# Altium footprint library DM2097_R1M1E1.PcbLib: 70 footprints (part 1 of 5)
Each footprint in its own frame and in the unit in brackets; x right, y up, seen from the top. Pads: shape width x height; smd on the part's side, far side on the other; paste and mask are expansions set on the pad; w line width, h text height; cw(c..) or ccw(c..) is an arc to the next point about the centre after c.
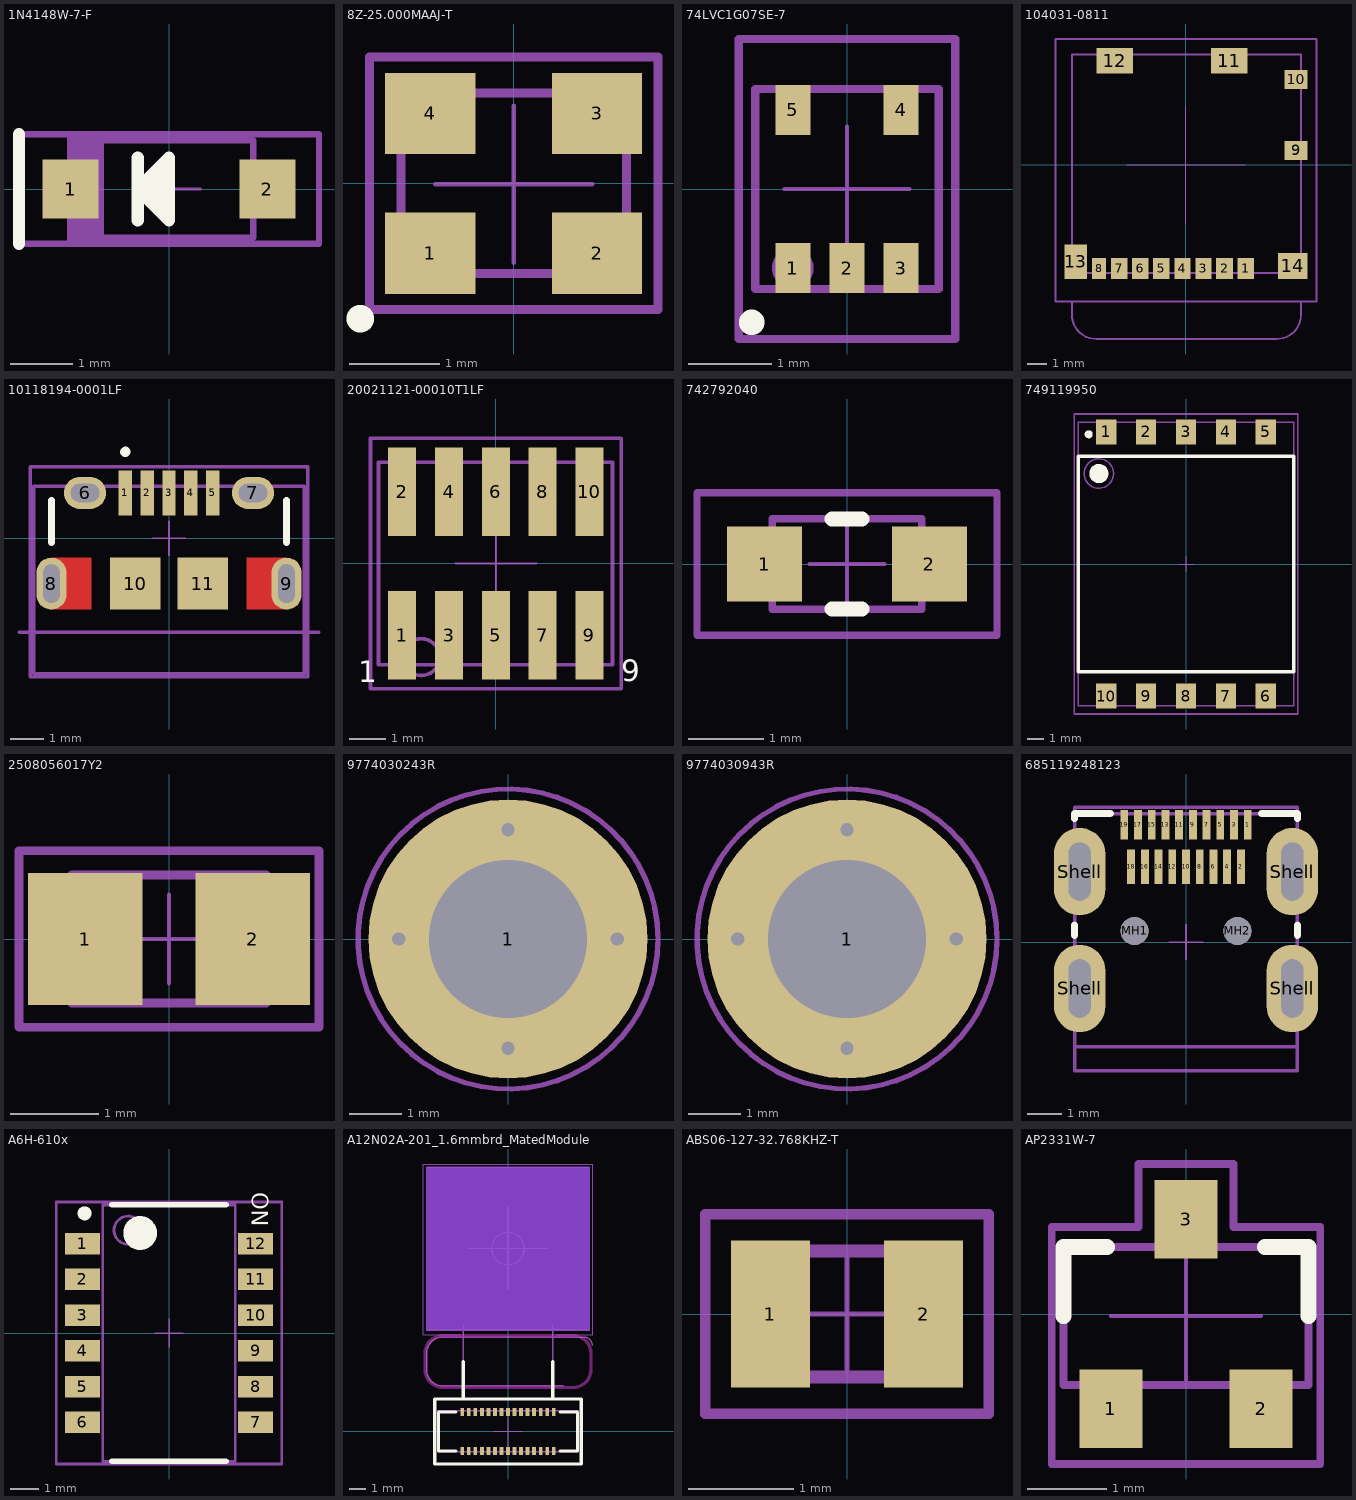
[diagram p0: the footprints below, top view; thin cyan lines are the x and y axes]

## 1N4148W-7-F [mm] "SOD123, 2-Leads, Body 2.7x1.55mm, Height 1.45mm"
height 1.45
pads (2):
  rect 0.9x0.95 smd: 1(-1.575,0) 2(1.575,0)
Top Overlay:
  region: 0,-0.5 0,0.5 -0.5,0
  lines w0.2: -2.4,-0.875 -2.4,0.875 ; -0.5,-0.5 -0.5,0 ; -0.5,0.5 -0.5,0 ; -0.5,0 0,-0.5 0,0.5 -0.5,0
Top Assembly:
  region: -1.044,-0.875 -1.044,0.875 -1.628,0.875 -1.628,-0.875
  lines w0.1: -2.4,-0.875 -2.4,0.875 2.4,0.875 2.4,-0.875 -2.4,-0.875
  text "'.Designator'" at 0,0 h1
Top Courtyard:
  lines w0.05: -0.5,0 0.5,0 ; 0,-0.5 0,0.5 ; -2.4,-0.875 -2.4,0.875 2.4,0.875 2.4,-0.875 -2.4,-0.875
Top Component Outline:
  lines w0.1: -1.35,-0.775 1.35,-0.775 1.35,0.775 -1.35,0.775 -1.35,-0.775
3D body: height 1.45, standoff 0, extent -1.35,-0.775 1.35,0.775

## 8Z-25.000MAAJ-T [mm] "2.5 x 2.0 x 0.5mm 8Z series XTAL"
height 0.55
pads (4):
  rect 1x0.9 smd: 1(-0.925,-0.775) 2(0.925,-0.775) 3(0.925,0.775) 4(-0.925,0.775)
Top Overlay:
  circle w0.254: c-1.7,-1.5 r0.025
Top Assembly:
  lines w0.1: -1.6,-1.4 -1.6,1.4 1.6,1.4 1.6,-1.4 -1.6,-1.4
  text "'.Designator'" at 0,-0.011 h1
Top Courtyard:
  lines w0.05: -0.87,-0.011 0,-0.011 ; 0,-0.881 0,-0.011 ; 0,0.859 0,-0.011 ; 0.87,-0.011 0,-0.011 ; -1.6,-1.4 -1.6,1.4 1.6,1.4 1.6,-1.4 -1.6,-1.4
Top Component Outline:
  lines w0.1: -1.25,-1 1.25,-1 1.25,1 -1.25,1 -1.25,-1
3D body: height 0.55, standoff 0, extent -1.25,-1 1.25,1

## 74LVC1G07SE-7 [mm] "SC70-5 1.1mm"
height 1.1
pads (5):
  rect 0.42x0.6 smd paste-0.025 mask+0.05: 1(-0.65,-0.95) 2(0,-0.95) 3(0.65,-0.95) 4(0.65,0.95) 5(-0.65,0.95)
Top Overlay:
  circle w0.254: c-1.143,-1.6 r0.025
Top Assembly:
  circle w0.1: c-0.65,-0.95 r0.2
  lines w0.1: -1.3,-1.8 -1.3,1.8 1.3,1.8 1.3,-1.8 -1.3,-1.8
  text "'.Designator'" at 0,0 h1
Top Courtyard:
  lines w0.05: -0.75,0 0,0 ; 0,-0.75 0,0 ; 0,0.75 0,0 ; 0.75,0 0,0 ; -1.3,-1.8 1.3,-1.8 1.3,1.8 -1.3,1.8 -1.3,-1.8
Top Component Outline:
  lines w0.1: -1.1,-1.2 1.1,-1.2 1.1,1.2 -1.1,1.2 -1.1,-1.2
3D body "User Library-SOT353-1.step": height 1.1, standoff 0, extent -1.1,-1.2 1.1,1.2

## 104031-0811 [mm] "10 (8 + 2) Position Card Connector Secure Digital - microSD™ Surface Mount, Right Angle Gold"
height 1.42
pads (14):
  rect 0.85x1.1 smd: 1(3.113,-5.412) 3(0.913,-5.412) 4(-0.188,-5.412) 5(-1.288,-5.412) 6(-2.387,-5.412) 7(-3.487,-5.412)
  rect 0.875x1.1 smd: 2(2.013,-5.412)
  rect 0.75x1.1 smd: 8(-4.537,-5.412)
  rect 1.2x1 smd: 9(5.748,0.738) 10(5.748,4.438)
  rect 1.9x1.35 smd: 11(2.248,5.413) 12(-3.722,5.413)
  rect 1.17x1.8 smd: 13(-5.747,-5.062)
  rect 1.55x1.35 smd: 14(5.573,-5.287)
Top Assembly:
  lines w0.1: -5.95,-7.15 -5.95,-7.83 ccw(c-4.68,-7.83) -4.68,-9.1 -3.7,-9.1 4.73,-9.1 ccw(c4.73,-7.83) 6,-7.83 6,-7.15 ; -5.95,-7.15 -6.8,-7.15 -6.8,-6.75 -6.8,6.55 4.1,6.55 6.8,6.55 6.8,-5.412 6.8,-7.15 6,-7.15 ; -5.95,-7.15 6,-7.15
  text "'.Designator'" at 0,0 h1
Top Courtyard:
  lines w0.05: -3.1,0 0,0 ; 0,-3.1 0,0 ; 0,3.1 0,0 ; 3.1,0 0,0 ; -6.8,-7.15 -6.8,6.55 6.8,6.55 6.8,-7.15 -6.8,-7.15
Top Component Outline:
  lines w0.1: -5.95,-5.65 6,-5.65 6,5.75 -5.95,5.75 -5.95,-5.65
3D body "1040310811.stp": height 1.44, standoff -0.01, extent -5.95,-5.65 6,5.75

## 10118194-0001LF [mm] "FCI-10118194-0001LF-5_V SMD, 5-Leads, Body 7x5mm, Pitch 0.65 mm"
height 2.673
pads (11):
  rect 0.4x1.35 smd: 1(-1.3,1.35) 2(-0.65,1.35) 3(0,1.35) 4(0.65,1.35) 5(1.3,1.35)
  oval 1.25x0.95 hole 0.55 slot 0.85 at 0 deg: 6(-2.5,1.35) 7(2.5,1.35)
  oval 0.9x1.55 hole 0.5 slot 1.15 at 90 deg: 8(-3.5,-1.35) 9(3.5,-1.35)
  rect 1.5x1.55 smd: 10(-1,-1.35) 11(1,-1.35)
Top Layer:
  region: 3.5,-2.125 3.5,-0.575 2.3,-0.575 2.3,-2.125
  region: -2.3,-2.125 -2.3,-0.575 -3.5,-0.575 -3.5,-2.125
Top Overlay:
  circle w0.254: c-1.3,2.575 r0.025
  lines w0.2: -3.5,-0.125 -3.5,1.13 ; 3.5,-0.125 3.5,1.13
Top Assembly:
  lines w0.1: -4.465,-2.8 0,-2.8 4.465,-2.8 ; -4.125,-4.13 -4.125,2.125 4.125,2.125 4.125,-4.13 -4.125,-4.13
  text "PCB EDGE" at -7.2,-2.9 h0.3
  text "'.Designator'" at 1.93,0.076 h1
Top Courtyard:
  lines w0.05: -0.5,0 0.5,0 ; 0,-0.5 0,0.5 ; -4.125,-4.13 4.125,-4.13 4.125,2.125 -4.125,2.125 -4.125,-4.13
Top Component Outline:
  lines w0.1: -4.025,-4.03 4.025,-4.03 4.025,1.55 -4.025,1.55 -4.025,-4.03
3D body "10118194c.stp": height 2.72, standoff -0.55, extent -4.025,-4.03 4.025,1.55

## 20021121-00010T1LF [mm] "Connector Header Surface Mount 10 position 0.050\" (1.27mm)   Contact length: 0.120\" (3.05mm)"
height 4
pads (10):
  rect 0.76x2.4 smd: 1(-2.54,-1.95) 2(-2.54,1.95) 3(-1.27,-1.95) 4(-1.27,1.95) 5(0,-1.95) 6(0,1.95) 7(1.27,-1.95) 8(1.27,1.95) 9(2.54,-1.95) 10(2.54,1.95)
Top Overlay:
  text "9" at 3.4,-3.4 h1
  text "1" at -3.737,-3.429 h1
Top Assembly:
  lines w0.1: -3.4,-3.4 -3.4,3.4 3.4,3.4 3.4,-3.4 -3.4,-3.4 ; -1.524,-2.54 ccw(c-2.024,-2.54) -1.524,-2.54
  text "'.Designator'" at 0,0 h1
Top Courtyard:
  lines w0.05: -1.1,0 0,0 ; 0,-1.1 0,0 ; 0,1.1 0,0 ; 1.1,0 0,0 ; -3.4,-3.4 3.4,-3.4 3.4,3.4 -3.4,3.4 -3.4,-3.4
Top Component Outline:
  lines w0.1: -3.184,-2.75 3.166,-2.75 3.166,2.75 -3.184,2.75 -3.184,-2.75
3D body "20021121-00010T1LF.stp": height 4.55, standoff 0, extent -3.184,-2.75 3.166,2.75

## 742792040 [mm] "Chip Inductor, 2-Leads, Body 2.0x1.2mm"
height 1.1
pads (2):
  rect 1x1 smd: 1(-1.1,0) 2(1.1,0)
Top Overlay:
  lines w0.1: 0,0.6 -0.2,0.6 ; -0.2,0.6 -0.2,0.6
  lines w0.2: -0.2,-0.6 0.2,-0.6 ; -0.2,0.6 0.2,0.6
Top Assembly:
  lines w0.1: -2,-0.95 -2,0.95 2,0.95 2,-0.95 -2,-0.95
  text "'.Designator'" at 0,0 h1
Top Courtyard:
  lines w0.05: -0.5,0 0.5,0 ; 0,-0.5 0,0.5 ; -2,-0.95 -2,0.95 2,0.95 2,-0.95 -2,-0.95
Top Component Outline:
  lines w0.1: -1,-0.6 -1,0.6 1,0.6 1,-0.6 -1,-0.6
3D body "74279201.stp": height 0.89, standoff -0.01, extent -1,-0.6 1,0.6

## 749119950 [mm] "SMD, 10-Leads, Body 13.5x14.0mm (max), Pitch 2.48mm, IPC Medium Density"
height 12.5
pads (10):
  rect 1.27x1.55 smd: 1(-5,8.275) 2(-2.5,8.275) 3(0,8.275) 4(2.5,8.275) 5(5,8.275) 6(5,-8.275) 7(2.5,-8.275) 8(0,-8.275) 9(-2.5,-8.275) 10(-5,-8.275)
Top Overlay:
  circle w0.25: c-6.096,8.13 r0.125
  circle w0.6: c-5.461,5.669 r0.3
  lines w0.2: -6.75,-6.75 6.75,-6.75 6.75,6.75 -6.75,6.75 -6.75,-6.75
Top Assembly:
  circle w0.1: c-5.461,5.669 r0.921
  lines w0.1: -7,-9.4 7,-9.4 7,4.75 7,9.4 -7,9.4 -7,9.1 -7,-9.4
  text "'.Designator'" at 0,0 h1
Top Courtyard:
  lines w0.05: -0.5,0 0.5,0 ; 0,-0.5 0,0.5 ; -7,-9.4 7,-9.4 7,9.4 -7,9.4 -7,-9.4
Top Component Outline:
  lines w0.1: -6.75,-8.875 6.75,-8.875 6.75,8.875 -6.75,8.875 -6.75,-8.875
3D body "WE-PoE_EP13_PoE.stp": height 12.6, standoff 0.1, extent -6.75,-8.875 6.75,8.875

## 2508056017Y2 [mm] "2508056017Y2 Chip Inductor, 2-Leads, Body 2.00x1.25mm"
height 1.1
pads (2):
  rect 1.3x1.5 smd: 1(-0.95,0) 2(0.95,0)
Top Assembly:
  lines w0.1: -1.7,-1 1.7,-1 1.7,1 -1.7,1 -1.7,-1
  text "'.Designator'" at 0.004,0 h1
Top Courtyard:
  lines w0.05: -0.5,0 0.5,0 ; 0,-0.5 0,0.5 ; -1.7,-1 -1.7,1 1.7,1 1.7,-1 -1.7,-1
Top Component Outline:
  lines w0.1: -1.1,-0.725 1.1,-0.725 1.1,0.725 -1.1,0.725 -1.1,-0.725
3D body: height 1.45, standoff 0, extent -0.596,-0.725 0.604,0.725
3D body: height 1.45, standoff 0, extent -1.096,-0.725 -0.596,0.725
3D body: height 1.45, standoff 0, extent 0.604,-0.725 1.104,0.725

## 9774030243R [mm] "STANDOFF_M2X0.4_3MM with no pad on bottom of PCB"
height 3
pads (1):
  round 5.3 / inner round 2.7 / far side round 5.3 hole 3 mask+0.05: 1(0,0)
via 0,2.075 diameter 0.508 hole 0.254
via 0,-2.075 diameter 0.508 hole 0.254
via -2.075,0 diameter 0.508 hole 0.254
via 2.075,0 diameter 0.508 hole 0.254
Top Paste:
  region: 0.317,2.581 0.278,1.576 0.397,1.55 0.628,1.471 0.845,1.359 1.042,1.214 1.214,1.042 1.359,0.845 1.471,0.628 1.55,0.397 1.576,0.278 2.581,0.317 2.554,0.531 2.432,0.946 2.242,1.334 1.991,1.686 1.686,1.991 1.334,2.242 0.946,2.432 0.531,2.554
  region: 2.581,-0.317 1.576,-0.278 1.55,-0.397 1.471,-0.628 1.359,-0.845 1.214,-1.042 1.042,-1.214 0.845,-1.359 0.628,-1.471 0.397,-1.55 0.278,-1.576 0.317,-2.581 0.531,-2.554 0.946,-2.432 1.334,-2.242 1.686,-1.991 1.991,-1.686 2.242,-1.334 2.432,-0.946 2.554,-0.531
  region: -0.317,-2.581 -0.278,-1.576 -0.397,-1.55 -0.628,-1.471 -0.845,-1.359 -1.042,-1.214 -1.214,-1.042 -1.359,-0.845 -1.471,-0.628 -1.55,-0.397 -1.576,-0.278 -2.581,-0.317 -2.554,-0.531 -2.432,-0.946 -2.242,-1.334 -1.991,-1.686 -1.686,-1.991 -1.334,-2.242 -0.946,-2.432 -0.531,-2.554
  region: -2.581,0.317 -1.576,0.278 -1.55,0.397 -1.471,0.628 -1.359,0.845 -1.214,1.042 -1.042,1.214 -0.845,1.359 -0.628,1.471 -0.397,1.55 -0.278,1.576 -0.317,2.581 -0.531,2.554 -0.946,2.432 -1.334,2.242 -1.686,1.991 -1.991,1.686 -2.242,1.334 -2.432,0.946 -2.554,0.531
Top Assembly:
  circle w0.1: c0,0 r2.85
  text "'.Designator'" at 0,0 h1
Top Courtyard:
  circle w0.05: c0,0 r2.85
  lines w0.05: -0.5,0 0.5,0 ; 0,-0.5 0,0.5
Bottom Courtyard:
  circle w0.05: c0,0 r2.85
Top Component Outline:
  circle w0.1: c0,0 r2.175
3D body "9774030243R (rev1).stp": height 3.05, standoff -1.35, extent -2.175,-2.172 2.175,2.172

## 9774030943R [mm] "STANDOFF_2.25mmX0.4_3MM with pad on bottom of PCB"
height 3
pads (1):
  round 5.3 / inner round 2.7 / far side round 5.3 hole 3 mask+0.05: 1(0,0)
via 2.075,0 diameter 0.508 hole 0.254
via -2.075,0 diameter 0.508 hole 0.254
via 0,-2.075 diameter 0.508 hole 0.254
via 0,2.075 diameter 0.508 hole 0.254
Top Paste:
  region: -2.581,0.317 -1.576,0.278 -1.55,0.397 -1.471,0.628 -1.359,0.845 -1.214,1.042 -1.042,1.214 -0.845,1.359 -0.628,1.471 -0.397,1.55 -0.278,1.576 -0.317,2.581 -0.531,2.554 -0.946,2.432 -1.334,2.242 -1.686,1.991 -1.991,1.686 -2.242,1.334 -2.432,0.946 -2.554,0.531
  region: -0.317,-2.581 -0.278,-1.576 -0.397,-1.55 -0.628,-1.471 -0.845,-1.359 -1.042,-1.214 -1.214,-1.042 -1.359,-0.845 -1.471,-0.628 -1.55,-0.397 -1.576,-0.278 -2.581,-0.317 -2.554,-0.531 -2.432,-0.946 -2.242,-1.334 -1.991,-1.686 -1.686,-1.991 -1.334,-2.242 -0.946,-2.432 -0.531,-2.554
  region: 2.581,-0.317 1.576,-0.278 1.55,-0.397 1.471,-0.628 1.359,-0.845 1.214,-1.042 1.042,-1.214 0.845,-1.359 0.628,-1.471 0.397,-1.55 0.278,-1.576 0.317,-2.581 0.531,-2.554 0.946,-2.432 1.334,-2.242 1.686,-1.991 1.991,-1.686 2.242,-1.334 2.432,-0.946 2.554,-0.531
  region: 0.317,2.581 0.278,1.576 0.397,1.55 0.628,1.471 0.845,1.359 1.042,1.214 1.214,1.042 1.359,0.845 1.471,0.628 1.55,0.397 1.576,0.278 2.581,0.317 2.554,0.531 2.432,0.946 2.242,1.334 1.991,1.686 1.686,1.991 1.334,2.242 0.946,2.432 0.531,2.554
Top Assembly:
  circle w0.1: c0,0 r2.85
  text "'.Designator'" at 0,0 h1
Top Courtyard:
  circle w0.05: c0,0 r2.85
  lines w0.05: -0.5,0 0.5,0 ; 0,-0.5 0,0.5
Bottom Courtyard:
  circle w0.05: c0,0 r2.85
Top Component Outline:
  circle w0.1: c0,0 r2.175
3D body "9774030943 (rev1).stp": height 3.05, standoff -1.35, extent -2.175,-2.172 2.175,2.172

## 685119248123 [mm] "Micro HDMI Horizontal SMT"
height 3
pads (25):
  rect 0.23x0.85 smd: 1(1.8,3.425) 3(1.4,3.425) 5(1,3.425) 7(0.6,3.425) 9(0.2,3.425) 11(-0.2,3.425) 13(-0.6,3.425) 15(-1,3.425) 17(-1.4,3.425) 19(-1.8,3.425)
  rect 0.23x1 smd: 2(1.6,2.2) 4(1.2,2.2) 6(0.8,2.2) 8(0.4,2.2) 10(0,2.2) 12(-0.4,2.2) 14(-0.8,2.2) 16(-1.2,2.2) 18(-1.6,2.2)
  round 0.81 hole 0.81 unplated: MH1(-1.5,0.33) MH2(1.5,0.33)
  oval 1.5x2.55 hole 0.65 slot 1.7 at 90 deg: Shell(-3.1,-1.35) Shell(-3.1,2.06) Shell(3.1,-1.35) Shell(3.1,2.06)
Top Overlay:
  lines w0.2: -3.25,0.2 -3.25,0.5 ; -3.25,3.6 -3.25,3.75 -2.2,3.75 ; 2.2,3.75 3.25,3.75 3.25,3.6 ; 3.25,0.2 3.25,0.5
Top Assembly:
  lines w0.1: -3.25,-3.05 3.25,-3.05 3.25,3.937 -3.25,3.937 -3.25,-3.05
  text "'.Designator'" at 0,0 h1
  text "PCB Edge" at -1.219,-3.683 h0.41
Top 3D Body:
  lines w0.1: -3.25,-3.75 3.25,-3.75 3.25,3.75 -3.25,3.75 -3.25,-3.75
Top Courtyard:
  lines w0.05: -0.5,0 0.5,0 ; 0,-0.5 0,0.5
3D body "685119248123.stp": height 2.99, standoff -1.11, extent -3.25,-3.75 3.25,3.755

## A6H-610x [mm] "DIP Sw, Std/SealTape Body 8.85x4.50mm, Pitch 1.27mm, IPC High Density"
height 1.55
pads (12):
  rect 1.25x0.76 smd: 1(-3.075,3.175) 2(-3.075,1.905) 3(-3.075,0.635) 4(-3.075,-0.635) 5(-3.075,-1.905) 6(-3.075,-3.175) 7(3.075,-3.175) 8(3.075,-1.905) 9(3.075,-0.635) 10(3.075,0.635) 11(3.075,1.905) 12(3.075,3.175)
Top Overlay:
  circle w0.25: c-3,4.25 r0.125
  circle w0.6: c-1.025,3.55 r0.3
  lines w0.2: -2.025,-4.55 2.025,-4.55 ; -2.025,4.55 2.025,4.55
  text "ON" at 2.75,5 h1
Top Assembly:
  circle w0.1: c-1.45,3.65 r0.5
  lines w0.1: -4,-4.65 -4,4.65 4,4.65 4,-4.65 -4,-4.65
  text "'.Designator'" at 0,0 h1
Top Courtyard:
  lines w0.05: -0.5,0 0.5,0 ; 0,-0.5 0,0.5 ; -4,-4.65 -4,4.65 4,4.65 4,-4.65 -4,-4.65
Top Component Outline:
  lines w0.1: -2.35,-4.55 -2.35,4.55 2.35,4.55 2.35,-4.55 -2.35,-4.55
3D body "KAN1106Rx.stp": height 1.57, standoff 0, extent -3.35,-4.425 3.35,4.425

## A12N02A-201_1.6mmbrd_MatedModule [mm] "connector: 24-5804-030-000-829+ (1.4mm height w/ module mated)"
height 1.4
pads (30):
  rect 0.22x0.5 smd mask+0.05: 1(-2.8,-1.2) 2(-2.4,-1.2) 3(-2,-1.2) 4(-1.6,-1.2) 5(-1.2,-1.2) 6(-0.8,-1.2) 7(-0.4,-1.2) 8(0,-1.2) 9(0.4,-1.2) 10(0.8,-1.2) 11(1.2,-1.2) 12(1.6,-1.2) 13(2,-1.2) 14(2.4,-1.2) 15(2.8,-1.2) 16(2.8,1.2) 17(2.4,1.2) 18(2,1.2) 19(1.6,1.2) 20(1.2,1.2) 21(0.8,1.2) 22(0.4,1.2) 23(0,1.2) 24(-0.4,1.2) 25(-0.8,1.2) 26(-1.2,1.2) 27(-1.6,1.2) 28(-2,1.2) 29(-2.4,1.2) 30(-2.8,1.2)
Bottom Layer keep-out:
  region: -4.999,16.237 4.999,16.237 4.999,6.239 -4.999,6.239
Top Overlay:
  lines w0.2: -3.2,-1.2 -4.275,-1.2 -4.275,1.2 -3.2,1.2 ; -2.75,2 -2.75,4.3 ; 2.75,2 2.75,4.3 ; 3.2,-1.2 4.275,-1.2 4.275,1.2 3.2,1.2 ; -4.5,-2 4.5,-2 4.5,2 -4.5,2 -4.5,-2
Bottom Overlay:
  lines w0.2: -2.75,4.3 -2.75,6.6 ; 2.75,4.3 2.75,6.6 ; -5,6.238 5,6.238 5,16.238 -5,16.238 -5,6.238
Keep-Out Layer:
  lines w0.2: -5.1,3.8 ccw(c-4,3.8) -4,2.7 0,2.7 4,2.7 ccw(c4,3.8) 5.1,3.8 5.1,4.8 ccw(c4,4.8) 4,5.9 -4,5.9 ccw(c-4,4.8) -5.1,4.8 -5.1,3.8
Mechanical 1:
  lines w0.1: 3.382,2.8 -4,2.8 cw(c-4,3.8) -5,3.8 -5,4.8 cw(c-4,4.8) -4,5.8 4.671,5.8 cw(c4.671,5.289) 5.182,5.289
Top Assembly:
  lines w0.1: -2.75,4.3 -2.75,2 ; 2.75,4.3 2.75,2 ; -2.75,2 2.75,2 ; -2.75,2 -4.5,2 -4.5,-2 4.5,-2 4.5,2 2.75,2
  text "'.Designator'" at 0,0.006 h1
Bottom Assembly:
  circle w0.1: c0,11.238 r1
  lines w0.1: -2.75,4.3 -2.75,6.6 ; -2.51,11.238 2.51,11.238 ; 0,8.738 0,13.738 ; 2.75,4.3 2.75,6.6 ; 2.51,11.238 2.51,11.238 ; 4.999,16.238 4.999,6.239 -4.999,6.239 -4.999,16.237 5,16.237 5,16.238 ; 4.999,16.238 5,16.238
Top Courtyard:
  lines w0.05: -2.75,4.3 -2.75,2 ; -0.91,0.006 0,0.006 ; 0,-0.904 0,0.006 ; 0,0.916 0,0.006 ; 0.91,0.006 0,0.006 ; 2.75,4.3 2.75,2 ; -2.75,2 -4.5,2 -4.5,-2 4.5,-2 4.5,2 2.75,2 ; -2.75,2 2.75,2
Bottom Courtyard:
  lines w0.05: -2.91,5.938 -5.2,5.938 -5.2,16.438 5.2,16.438 5.2,15.238 5.2,5.938 3,5.938
Top Component Outline:
  lines w0.1: -4.3,-1.25 4.3,-1.25 4.3,1.262 -4.3,1.262 -4.3,-1.25
Bottom Component Outline:
  lines w0.1: -4.999,6.239 4.999,6.239 4.999,16.237 -4.999,16.237 -4.999,6.239
3D body: height 1.27, standoff 1.1, extent -2.75,2 2.75,4.3
3D body: height 1.4, standoff 1, extent -4.5,-2 4.5,2
3D body "K3D-WP7A-S030VA1-V2_JAE_Proprietary.STEP": height 0.65, standoff -0.03, extent -4.3,-1.25 4.3,1.262
3D body: height 0.55, standoff 0.35, extent -2.75,4.3 2.75,6.6
3D body: height 6.18, standoff 0.25, extent -4.999,6.239 4.999,16.237

## ABS06-127-32.768KHZ-T [mm] "2-SMD 0.079\" L x 0.047\" W (2.00mm x 1.20mm)"
height 0.6
pads (2):
  rect 0.75x1.4 smd: 1(-0.73,0) 2(0.73,0)
Top Assembly:
  lines w0.1: -1.35,-0.95 1.35,-0.95 1.35,0.95 -1.35,0.95 -1.35,-0.95
  text "'.Designator'" at 0,0.188 h1
Top Courtyard:
  lines w0.05: -0.6,0 0,0 ; 0,-0.6 0,0 ; 0,0.6 0,0 ; 0.6,0 0,0 ; -1.35,-0.95 1.35,-0.95 1.35,0.95 -1.35,0.95 -1.35,-0.95
Top Component Outline:
  lines w0.127: -1,-0.6 1,-0.6 1,0.6 -1,0.6 -1,-0.6
3D body "ABS06-32.768KHZ-9-T--3DModel-STEP-56544.STEP": height 0.65, standoff 0.05, extent -1,-0.6 1,0.6

## AP2331W-7 [mm]
pads (3):
  rect 0.8x1 smd: 1(-0.95,-1.2) 2(0.95,-1.2) 3(0,1.2)
Top Overlay:
  lines w0.2: -1.55,-0.025 -1.55,0.85 -1,0.85 ; 1,0.85 1.55,0.85 1.55,-0.025
Top Assembly:
  lines w0.1: -1.7,-1.9 -1.7,1.1 -0.6,1.1 -0.6,1.9 0.6,1.9 0.6,1.1 1.7,1.1 1.7,-1.9 -1.7,-1.9
  text "'.Designator'" at 0,-0.025 h1
Top Courtyard:
  lines w0.05: 0,-0.9 0,-0.025 ; 0,0.85 0,-0.025 ; 0.95,-0.025 0,-0.025 ; -0.95,-0.025 -0.95,-0.025 ; -0.95,-0.025 0,-0.025 ; 0,-0.025 0,-0.025 ; -1.7,-1.9 -1.7,1.1 -0.6,1.1 -0.6,1.9 0.6,1.9 0.6,1.1 1.7,1.1 1.7,-1.9 -1.7,-1.9
Top Component Outline:
  lines w0.1: -1.55,-0.9 -1.55,0.85 1.55,0.85 1.55,-0.9 -1.55,-0.9
3D body: height 1.4, standoff 0.1, extent -1.552,-0.9 1.552,0.85